# Altium footprint library VEGG_PcbLib_ALT.PcbLib: 140 footprints (part 8 of 9)
Each footprint in its own frame and in the unit in brackets; x right, y up, seen from the top. Pads: shape width x height; smd on the part's side, far side on the other; paste and mask are expansions set on the pad; w line width, h text height; cw(c..) or ccw(c..) is an arc to the next point about the centre after c.
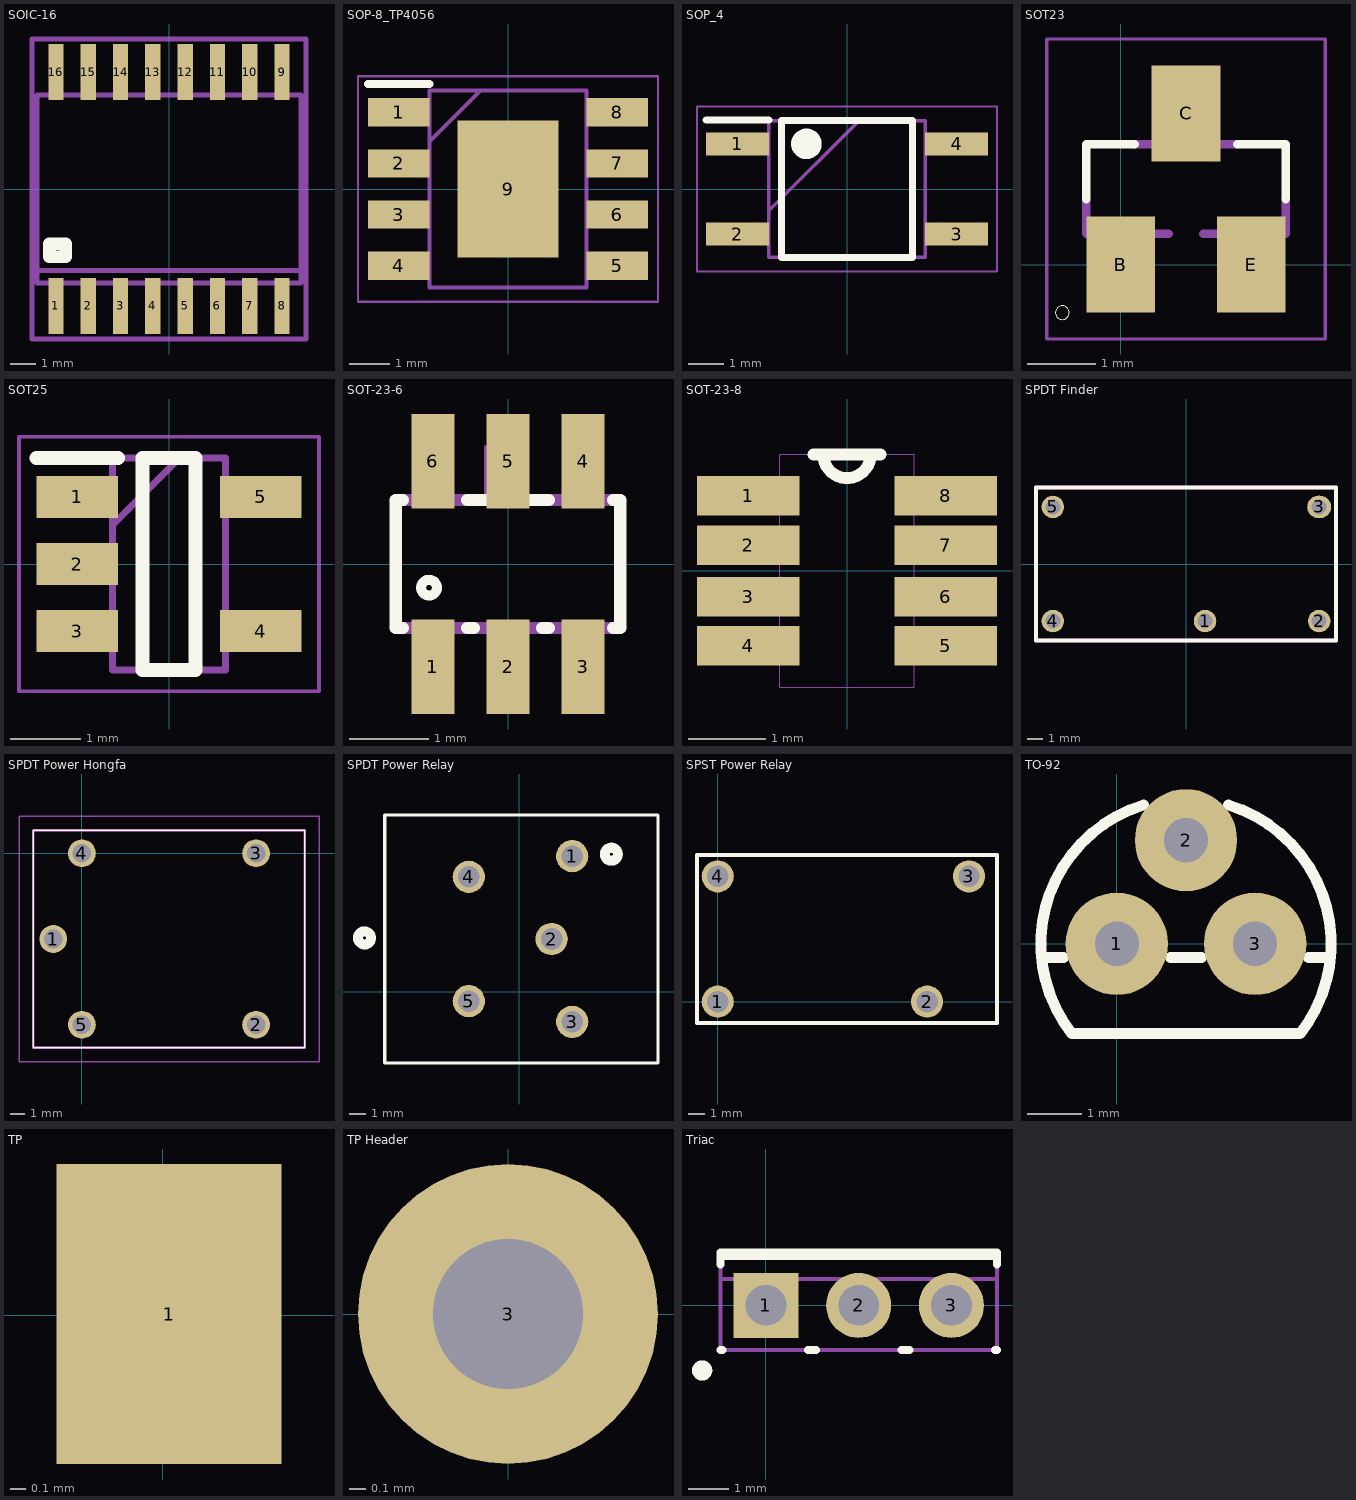
[diagram p7: the footprints below, top view; thin cyan lines are the x and y axes]

## SOIC-16 [mm] "Ds3231 RTC"
pads (16):
  rect 0.6x2.2 smd: 1(-4.445,-4.6) 2(-3.175,-4.6) 3(-1.905,-4.6) 4(-0.635,-4.6) 5(0.635,-4.6) 6(1.905,-4.6) 7(3.175,-4.6) 8(4.445,-4.6) 9(4.445,4.6) 10(3.175,4.6) 11(1.905,4.6) 12(0.635,4.6) 13(-0.635,4.6) 14(-1.905,4.6) 15(-3.175,4.6) 16(-4.445,4.6)
Top Overlay:
  lines w0.5: -4.699,-2.667 -4.699,-2.159 -4.064,-2.159 -4.064,-2.667 -4.699,-2.667
Mechanical 4:
  region: -4.698,-3.8 -4.2,-3.8 -4.2,-5.329 -4.698,-5.329
  region: -3.421,-3.8 -2.93,-3.8 -2.93,-5.322 -3.421,-5.322
  region: -2.153,-3.8 -1.66,-3.8 -1.66,-5.326 -2.153,-5.326
  region: -0.882,-3.8 -0.39,-3.8 -0.39,-5.329 -0.882,-5.329
  region: 0.39,-3.8 0.88,-3.8 0.88,-5.321 0.39,-5.321
  region: 1.662,-3.8 2.15,-3.8 2.15,-5.327 1.662,-5.327
  region: 2.932,-3.8 3.42,-3.8 3.42,-5.323 2.932,-5.323
  region: 4.204,-3.8 4.69,-3.8 4.69,-5.325 4.204,-5.325
  region: 4.204,5.32 4.69,5.32 4.69,3.804 4.204,3.804
  region: 2.934,5.32 3.42,5.32 3.42,3.806 2.934,3.806
  region: 1.66,5.32 2.15,5.32 2.15,3.801 1.66,3.801
  region: 0.391,5.32 0.88,5.32 0.88,3.807 0.391,3.807
  region: -0.882,5.32 -0.39,5.32 -0.39,3.807 -0.882,3.807
  region: -2.15,5.32 -1.66,5.32 -1.66,3.801 -2.15,3.801
  region: -3.423,5.32 -2.93,5.32 -2.93,3.804 -3.423,3.804
  region: -4.695,5.32 -4.2,5.32 -4.2,3.804 -4.695,3.804
  region: -4.698,-3.8 -4.2,-3.8 -4.2,-5.329 -4.698,-5.329
  region: -3.421,-3.8 -2.93,-3.8 -2.93,-5.322 -3.421,-5.322
  region: -2.153,-3.8 -1.66,-3.8 -1.66,-5.326 -2.153,-5.326
  region: -0.882,-3.8 -0.39,-3.8 -0.39,-5.329 -0.882,-5.329
  region: 0.39,-3.8 0.88,-3.8 0.88,-5.321 0.39,-5.321
  region: 1.662,-3.8 2.15,-3.8 2.15,-5.327 1.662,-5.327
  region: 2.932,-3.8 3.42,-3.8 3.42,-5.323 2.932,-5.323
  region: 4.204,-3.8 4.69,-3.8 4.69,-5.325 4.204,-5.325
  region: 4.204,5.32 4.69,5.32 4.69,3.804 4.204,3.804
  region: 2.934,5.32 3.42,5.32 3.42,3.806 2.934,3.806
  region: 1.66,5.32 2.15,5.32 2.15,3.801 1.66,3.801
  region: 0.391,5.32 0.88,5.32 0.88,3.807 0.391,3.807
  region: -0.882,5.32 -0.39,5.32 -0.39,3.807 -0.882,3.807
  region: -2.15,5.32 -1.66,5.32 -1.66,3.801 -2.15,3.801
  region: -3.423,5.32 -2.93,5.32 -2.93,3.804 -3.423,3.804
  region: -4.695,5.32 -4.2,5.32 -4.2,3.804 -4.695,3.804
  lines w0.203: -5.19,-3.7 5.19,-3.7 ; -5.19,-3.7 -5.19,-3.2 ; -5.19,-3.7 5.19,-3.7 ; -5.19,-3.7 -5.19,-3.2 ; -5.19,-3.2 -5.19,3.7 ; -5.19,-3.2 5.19,-3.2 ; -5.19,-3.2 -5.19,3.7 ; -5.19,-3.2 5.19,-3.2 ; -5.19,3.7 5.19,3.7 ; -5.19,3.7 5.19,3.7 ; 5.19,-3.7 5.19,-3.2 ; 5.19,-3.7 5.19,-3.2 ; 5.19,-3.2 5.19,3.7 ; 5.19,-3.2 5.19,3.7
Mechanical 13:
  lines w0.2: -5.395,-5.9 -5.395,5.9 5.395,5.9 5.395,-5.9 -5.395,-5.9
3D body "Package, SOIC-16, 7.5mm.STEP": height 2.3, standoff 0, extent -5.15,-5.15 5.15,5.15

## SOP-8_TP4056 [mm] "BAT charging TP4056"
pads (9):
  rect 1.525x0.7 smd: 1(-2.712,1.905) 2(-2.712,0.635) 3(-2.712,-0.635) 4(-2.712,-1.905) 5(2.712,-1.905) 6(2.712,-0.635) 7(2.712,0.635) 8(2.712,1.905)
  rect 2.513x3.402 smd: 9(0,0)
Top Overlay:
  lines w0.2: -3.475,2.605 -1.95,2.605
Mechanical 13:
  lines w0.1: -1.95,1.18 -0.68,2.45 ; -1.95,-2.45 -1.95,2.45 1.95,2.45 1.95,-2.45 -1.95,-2.45
Mechanical 15:
  lines w0.05: -3.725,-2.8 -3.725,2.8 3.725,2.8 3.725,-2.8 -3.725,-2.8
3D body "TP4056.stp": height 1.75, standoff 0, extent -3,-2.45 3,2.45

## SOP_4 [mm] "opto-coupler"
pads (4):
  rect 1.775x0.65 smd: 1(-3.088,1.27) 2(-3.088,-1.27) 3(3.088,-1.27) 4(3.088,1.27)
Top Overlay:
  circle w0.5: c-1.143,1.27 r0.18
  lines w0.2: -3.975,1.945 -2.2,1.945 ; -1.85,-1.925 1.85,-1.925 1.85,1.925 -1.85,1.925 -1.85,-1.925
Mechanical 15:
  lines w0.1: -2.2,-0.615 0.34,1.925 ; -2.2,-1.925 2.2,-1.925 2.2,1.925 -2.2,1.925 -2.2,-1.925
Mechanical 20:
  lines w0.05: -4.225,-2.325 4.225,-2.325 4.225,2.325 -4.225,2.325 -4.225,-2.325
3D body "VOM617A-2X001T.stp": height 2.4, standoff 0, extent -3.375,-1.925 3.375,1.925

## SOT23 [mm] "PNP Transistor Pack"
pads (3):
  rect 1x1.4 smd: B(0,0) C(0.95,2.2) E(1.9,0)
Top Overlay:
  circle w0: c-0.85,-0.7 r0.1
  lines w0.127: -0.5,0.95 -0.5,1.75 0.2,1.75 ; 1.7,1.75 2.4,1.75 2.4,0.95
Mechanical 1:
  region: 0.721,2.395 1.179,2.395 1.179,1.812 0.721,1.812
  region: 1.663,0.389 2.118,0.389 2.118,-0.199 1.663,-0.199
  region: -0.219,0.389 0.239,0.389 0.239,-0.196 -0.219,-0.196
  lines w0.127: -0.5,0.95 -0.5,0.45 0.7,0.45 ; 0.2,1.75 1.7,1.75 ; 1.2,0.45 2.4,0.45 2.4,0.95
Mechanical 4:
  lines w0.051: -1.073,-1.083 2.973,-1.083 2.973,3.283 -1.073,3.283 -1.073,-1.083
3D body "BSS138_D87Z--3DModel-STEP-56544.STEP": height 1.11, standoff -0.09, extent -0.507,-0.247 2.413,2.153
3D body: height 0.25, standoff 0, extent 0,0.889 0,0.889

## SOT25 [mm]
pads (5):
  rect 1.15x0.6 smd: 1(-1.3,0.95) 2(-1.3,0) 3(-1.3,-0.95) 4(1.3,-0.95) 5(1.3,0.95)
Top Overlay:
  lines w0.2: -1.875,1.5 -0.725,1.5 ; -0.375,-1.5 -0.375,1.5 0.375,1.5 0.375,-1.5 -0.375,-1.5
Mechanical 15:
  lines w0.1: -0.8,0.55 0.15,1.5 ; -0.8,-1.5 -0.8,1.5 0.8,1.5 0.8,-1.5 -0.8,-1.5
Mechanical 20:
  lines w0.05: -2.125,-1.8 -2.125,1.8 2.125,1.8 2.125,-1.8 -2.125,-1.8
3D body "AP22802AW5-7.stp": height 1.3, standoff 0, extent -1.45,-1.5 1.4,1.5

## SOT-23-6 [mm]
pads (6):
  rect 0.55x1.2 smd: 1(-0.95,-1.3) 2(0,-1.3) 3(0.95,-1.3) 4(0.95,1.3) 5(0,1.3) 6(-0.95,1.3)
Top Overlay:
  circle w0.127: c-1,-0.3 r0.1
  lines w0.152: -1.328,-0.81 -1.422,-0.81 -1.422,0.81 -1.328,0.81 ; -0.522,-0.81 -0.428,-0.81 ; -0.522,0.81 0.522,0.81 ; 0.428,-0.81 0.522,-0.81 ; 1.328,-0.81 1.422,-0.81 1.422,0.81 1.328,0.81
Mechanical 4:
  region: -0.3,1.5 0.2,1.5 0.2,0.85 -0.3,0.85
  region: -1.2,1.5 -0.7,1.5 -0.7,0.85 -1.2,0.85
  region: 0.7,1.5 1.2,1.5 1.2,0.85 0.7,0.85
  region: 0.7,-0.85 1.2,-0.85 1.2,-1.5 0.7,-1.5
  region: -0.25,-0.85 0.25,-0.85 0.25,-1.5 -0.25,-1.5
  region: -1.2,-0.85 -0.7,-0.85 -0.7,-1.5 -1.2,-1.5
  region: -0.3,1.5 0.2,1.5 0.2,0.85 -0.3,0.85
  region: -1.2,1.5 -0.7,1.5 -0.7,0.85 -1.2,0.85
  region: 0.7,1.5 1.2,1.5 1.2,0.85 0.7,0.85
  region: 0.7,-0.85 1.2,-0.85 1.2,-1.5 0.7,-1.5
  region: -0.25,-0.85 0.25,-0.85 0.25,-1.5 -0.25,-1.5
  region: -1.2,-0.85 -0.7,-0.85 -0.7,-1.5 -1.2,-1.5
  lines w0.152: -1.422,-0.81 1.422,-0.81 -1.422,-0.81 ; -1.422,0.81 1.422,0.81 -1.422,0.81
3D body "sot-23-6.stp": height 1.07, standoff -0.05, extent -1.46,-1.549 1.461,1.296

## SOT-23-8 [mil]
pads (8):
  rect 52x20 smd: 1(-50,38) 2(-50,13) 3(-50,-13) 4(-50,-38) 5(50,-38) 6(50,-13) 7(50,13) 8(50,38)
Top Overlay:
  lines w6: -17,59 -12,59 ; 17,59 12,59 ; -12,59 ccw(c0,59) 12,59 ; -12,59 12,59
Mechanical 4:
  lines w0: -59,-47 -59,-30 ; -59,-47 -34,-47 ; -59,-47 -59,-30 ; -59,-47 -34,-47 ; -59,-30 -34,-30 ; -59,-30 -34,-30 ; -59,-22 -59,-4 ; -59,-22 -34,-22 ; -59,-22 -59,-4 ; -59,-22 -34,-22 ; -59,-4 -34,-4 ; -59,-4 -34,-4 ; -59,4 -59,22 ; -59,4 -34,4 ; -59,4 -59,22 ; -59,4 -34,4 ; -59,22 -34,22 ; -59,22 -34,22 ; -59,30 -59,47 ; -59,30 -34,30 ; -59,30 -59,47 ; -59,30 -34,30 ; -59,47 -34,47 ; -59,47 -34,47 ; -34,-59 34,-59 ; -34,-59 -34,-47 ; -34,-59 34,-59 ; -34,-59 -34,-47 ; -34,-47 -34,-30 ; -34,-47 -34,-30 ; -34,-30 -34,-22 ; -34,-30 -34,-22 ; -34,-22 -34,-4 ; -34,-22 -34,-4 ; -34,-4 -34,4 ; -34,-4 -34,4 ; -34,4 -34,22 ; -34,4 -34,22 ; -34,22 -34,30 ; -34,22 -34,30 ; -34,30 -34,47 ; -34,30 -34,47 ; -34,47 -34,59 ; -34,47 -34,59 ; -34,59 -12,59 ; -34,59 -12,59 ; -12,59 ccw(c0,59) 12,59 ; -12,59 ccw(c0,59) 12,59 ; -12,59 12,59 ; -12,59 12,59 ; 12,59 34,59 ; 12,59 34,59 ; 34,-59 34,-47 ; 34,-59 34,-47 ; 34,-47 34,-30 ; 34,-47 59,-47 ; 34,-47 34,-30 ; 34,-47 59,-47 ; 34,-30 34,-22 ; 34,-30 59,-30 ; 34,-30 34,-22 ; 34,-30 59,-30 ; 34,-22 34,-4 ; 34,-22 59,-22 ; 34,-22 34,-4 ; 34,-22 59,-22 ; 34,-4 34,4 ; 34,-4 59,-4 ; 34,-4 34,4 ; 34,-4 59,-4 ; 34,4 34,22 ; 34,4 59,4 ; 34,4 34,22 ; 34,4 59,4 ; 34,22 34,30 ; 34,22 59,22 ; 34,22 34,30 ; 34,22 59,22 ; 34,30 34,47 ; 34,30 59,30 ; 34,30 34,47 ; 34,30 59,30 ; 34,47 34,59 ; 34,47 59,47 ; 34,47 34,59 ; 34,47 59,47 ; 59,-47 59,-30 ; 59,-47 59,-30 ; 59,-22 59,-4 ; 59,-22 59,-4 ; 59,4 59,22 ; 59,4 59,22 ; 59,30 59,47 ; 59,30 59,47
3D body "INA219AIDCNR.stp": height 57.09, standoff 0, extent -55.11,-57.08 55.12,57.1

## SPDT Finder [mm] "Socket PCB Relay"
pads (5):
  round 1.5 hole 1: 1(1.27,-3.81) 2(8.89,-3.81) 4(-8.89,-3.81) 5(-8.89,3.81)
  oval 1.6x1.5 hole 1: 3(8.89,3.81)
Top Overlay:
  lines w0.254: -10.015,-5.1 -10.015,5.1 10.015,5.1 10.015,-5.1 -10.015,-5.1
Mechanical 13:
  lines w0.254: -10.015,-5.1 10.015,-5.1 10.015,5.1 -10.015,5.1 -10.015,-5.1
3D body "3221.stp": height 10.3, standoff -3.2, extent -9.997,-5.102 10.203,4.998

## SPDT Power Hongfa [mm]
pads (5):
  round 1.95 hole 1.3: 1(-2,-6) 2(12.2,-12) 3(12.2,0) 4(0,0) 5(0,-12)
Top Overlay:
  lines w0.1: -3.4,-13.6 -3.4,1.6 15.6,1.6 15.6,-13.6 -3.4,-13.6
Mechanical 15:
  lines w0.2: -3.4,-13.6 -3.4,1.6 15.6,1.6 15.6,-13.6 -3.4,-13.6
Mechanical 20:
  lines w0.1: -4.4,-14.6 -4.4,2.6 16.6,2.6 16.6,-14.6 -4.4,-14.6
3D body: height 15.49, standoff 0, extent -3.425,-13.62 15.625,1.62

## SPDT Power Relay [mm] "SPDT 15x15"
pads (5):
  round 1.95 hole 1.3: 1(3.2,8.204) 2(1.956,3.2) 3(3.2,-1.803) 4(-3.048,6.96) 5(-3.048,-0.555)
Top Overlay:
  circle w0.6: c5.563,8.322 r0.395
  circle w0.6: c-9.347,3.267 r0.395
  lines w0.2: -8.128,-4.293 8.382,-4.293 8.382,10.693 -8.128,10.693 -8.128,-4.293
3D body: height 20, standoff 0, extent -8.128,-4.318 8.382,10.668

## SPST Power Relay [mm]
pads (4):
  round 1.95 hole 1.3: 1(0,0) 2(12.7,0) 3(15.24,7.6) 4(0,7.6)
Top Overlay:
  lines w0.254: -1.26,-1.3 -1.26,8.9 16.94,8.9 16.94,-1.3 -1.26,-1.3
Mechanical 15:
  lines w0.254: -1.26,-1.3 16.94,-1.3 16.94,8.9 -1.26,8.9 -1.26,-1.3
3D body: height 14.7, standoff 0, extent -1.27,-1.27 16.891,8.89

## SPST-T77S1D10-05 [mm] "power Relay"

## TO-92 [mil] "Tapped"
pads (3):
  round 74 hole 32: 1(0,0) 2(50,75) 3(100,0)
Top Overlay:
  lines w8: -54.52,-10 -38.73,-10 ; -32.74,-64.65 cw(c50,0) 19.3,100.41 ; -32.46,-65 132.46,-65 ; 38.73,-10 61.27,-10 ; 80.7,100.41 cw(c50,0) 132.74,-64.64 ; 138.73,-10 154.52,-10
3D body "SW3DPS-TO-92A-DEFAULT.STEP": height 157.48, standoff -134.25, extent -40,-40 140,90

## TP [mm] "Test Point"
pads (1):
  rect 1.5x2 smd: 1(0.04,0.01)

## TP Header [mm]
pads (1):
  round 1.8 hole 0.9: 3(0,0)

## Triac [mm]
pads (3):
  rect 1.6x1.6 hole 1: 1(0,0)
  round 1.6 hole 1: 2(2.28,0) 3(4.56,0)
Top Overlay:
  circle w0.25: c-1.57,-1.6 r0.125
  lines w0.2: -1.12,-1.1 -1.07,-1.1 ; -1.12,1 -1.12,1.3 5.68,1.3 5.68,1 ; -1.12,1.21 5.68,1.21 ; 1.03,-1.1 1.23,-1.1 ; 3.33,-1.1 3.53,-1.1 ; 5.63,-1.1 5.68,-1.1
Mechanical 13:
  lines w0.1: -1.12,0.65 5.68,0.65 ; -1.12,-1.1 5.68,-1.1 5.68,1.3 -1.12,1.3 -1.12,-1.1
Mechanical 15:
  lines w0.1: 1.78,0 2.78,0 ; 2.28,-0.5 2.28,0.5
3D body: height 9.3, standoff 2.6, extent -1.17,-1.15 5.73,1.35
3D body: height 9.7, standoff 9.3, extent -1.119,0.651 5.679,1.299